# Altium footprint library MinervaBots.PcbLib: 162 footprints (part 11 of 11)
Each footprint in its own frame and in the unit in brackets; x right, y up, seen from the top. Pads: shape width x height; smd on the part's side, far side on the other; paste and mask are expansions set on the pad; w line width, h text height; cw(c..) or ccw(c..) is an arc to the next point about the centre after c.
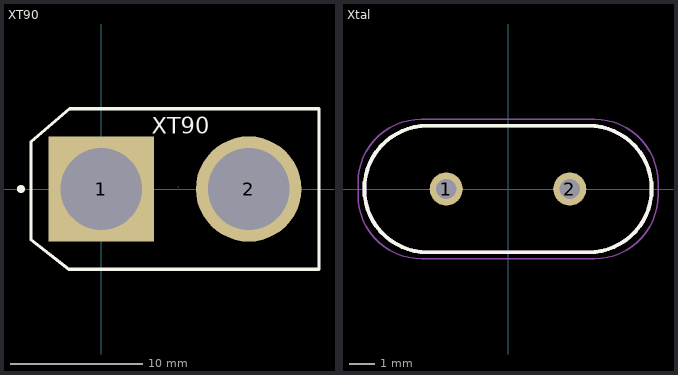
[diagram p10: the footprints below, top view; thin cyan lines are the x and y axes]

## XT90 [mm]
pads (2):
  rect 8x8 hole 6.2: 1(0,0)
  round 8 hole 6.2: 2(11.176,0)
Top Overlay:
  circle w0.3: c-6.096,0 r0.15
  lines w0.254: -5.334,-3.855 -5.334,3.588 -2.41,6.096 16.51,6.096 16.51,-6.096 -2.464,-6.096 -5.334,-3.855
  text "XT90" at 3.81,4.201 h1.25
Top Designator:
  text ".Designator" at -2.497,-0.508 h1.52
Mechanical 15:
  lines w0.003: 5.817,0.102 5.867,0.152
3D body "XT-90 (Male).STEP": height 20.7, standoff -5.5, extent -5.061,-5.525 16.339,5.475

## Xtal [mm]
pads (2):
  round 1.308 hole 0.8: 1(-2.44,0) 2(2.44,0)
Top Overlay:
  lines w0.152: -5.675,-0.002 ccw(c-3.177,-0.002) -3.177,-2.5 ; -5.675,0.002 cw(c-3.177,0.002) -3.177,2.5 ; -3.18,-2.5 3.18,-2.5 ; -3.18,2.5 3.18,2.5 ; 3.177,-2.5 ccw(c3.177,-0.002) 5.675,-0.002 ; 3.177,2.5 cw(c3.177,0.002) 5.675,0.002
Mechanical 1:
  lines w0.152: -5.675,0 ccw(c-3.175,0) -3.175,-2.5 3.175,-2.5 ccw(c3.175,0) 5.675,0 ccw(c3.175,0) 3.175,2.5 -3.175,2.5 ccw(c-3.175,0) -5.675,0
Top Designator:
  text ".Designator" at -7.618,-0.508 h1.52
Mechanical 4:
  lines w0.05: -5.925,-0.25 ccw(c-3.425,-0.25) -3.425,-2.75 3.425,-2.75 ccw(c3.425,-0.25) 5.925,-0.25 5.925,0.25 ccw(c3.425,0.25) 3.425,2.75 -3.425,2.75 ccw(c-3.425,0.25) -5.925,0.25 -5.925,-0.25
3D body "User Library-XTAL2.step": height 3.09, standoff -2.54, extent -5.434,-1.524 5.234,1.524